# Altium footprint library PcbLib1.PcbLib: 105 footprints (part 7 of 7)
Each footprint in its own frame and in the unit in brackets; x right, y up, seen from the top. Pads: shape width x height; smd on the part's side, far side on the other; paste and mask are expansions set on the pad; w line width, h text height; cw(c..) or ccw(c..) is an arc to the next point about the centre after c.
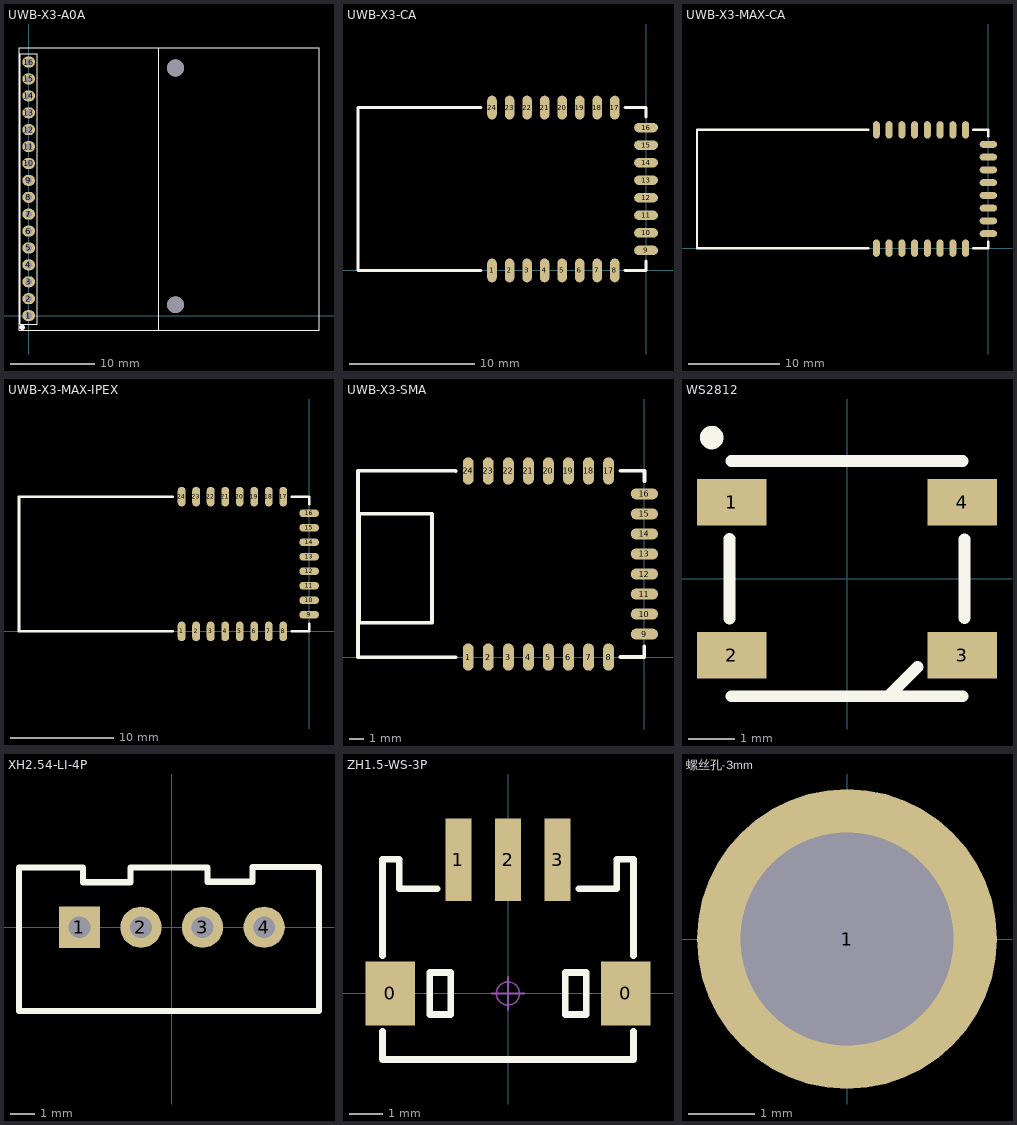
[diagram p6: the footprints below, top view; thin cyan lines are the x and y axes]

## UWB-X3-A0A [mm]
height 1.1
pads (16):
  oval 1.5x1.3 hole 0.8: 1(0,0) 2(0,2) 3(0,4) 4(0,6) 5(0,8) 6(0,10) 7(0,12) 8(0,14) 9(0,16) 10(0,18) 11(0,20) 12(0,22) 13(0,24) 14(0,26) 15(0,28) 16(0,30)
via 17.354,1.28 diameter 2 hole 2
via 17.354,29.28 diameter 2 hole 2
Top Overlay:
  circle w0.3: c-0.762,-1.397 r0.15
  lines w0.1: 15.409,-1.677 15.409,31.642 ; -1.146,-1.72 34.349,-1.72 34.349,31.679 -1.146,31.679 -1.146,-1.72 ; -1,-1 1,-1 1,31 -1,31 -1,-1
3D body: height 1.27, standoff 0, extent 21.654,2.988 29.654,10.982
3D body: height 1.27, standoff 0, extent 22.035,19.752 30.035,27.746
3D body: height 3, standoff 0.03, extent 3.62,0 16.701,29.972
3D body: height 1, standoff 0, extent -1.143,-1.824 1.016,31.623
3D body: height 1, standoff 0, extent 1.016,-1.778 34.417,31.669

## UWB-X3-CA [mil]
pads (24):
  oval 30x75 smd: 1(-484.25,0) 2(-429.13,0) 3(-374.02,0) 4(-318.9,0) 5(-263.78,0) 6(-208.66,0) 7(-153.54,0) 8(-98.43,0) 17(-98.43,511.81) 18(-153.54,511.81) 19(-208.66,511.81) 20(-263.78,511.81) 21(-318.9,511.81) 22(-374.02,511.81) 23(-429.13,511.81) 24(-484.25,511.81)
  oval 75x30 smd: 9(0,62.99) 10(0,118.11) 11(0,173.23) 12(0,228.35) 13(0,283.46) 14(0,338.58) 15(0,393.7) 16(0,448.82)
Top Overlay:
  lines w7.87: -66.93,0 0,0
  lines w10: -905.51,0 -519,-0.01 ; -905.51,0.25 -905.51,512.06 ; -905.51,511.81 -519,511.8 ; -65.74,512.06 0.25,512.06 0.25,483.07 ; 0,28.99 0,0 ; -66,0 -66,0 ; -66,0 -66,0 ; -66,0 0,0 ; 0,0 0,0
3D body: height 43.31, standoff 1, extent -630.24,240.16 -519.75,271.66
3D body: height 118.11, standoff 1, extent -867.2,162.48 -642.79,347.52
3D body: height 118.11, standoff 1, extent -510,69.97 -75.8,440.05
3D body: height 39.37, standoff 0.1, extent -900,0 0,511.81

## UWB-X3-MAX-CA [mil]
pads (24):
  oval 30x75 smd: 1(-484.25,0) 2(-429.13,0) 3(-374.02,0) 4(-318.9,0) 5(-263.78,0) 6(-208.66,0) 7(-153.54,0) 8(-98.43,0) 17(-98.43,511.81) 18(-153.54,511.81) 19(-208.66,511.81) 20(-263.78,511.81) 21(-318.9,511.81) 22(-374.02,511.81) 23(-429.13,511.81) 24(-484.25,511.81)
  oval 75x30 smd: 9(0,62.99) 10(0,118.11) 11(0,173.23) 12(0,228.35) 13(0,283.46) 14(0,338.58) 15(0,393.7) 16(0,448.82)
Top Overlay:
  lines w7.87: -66.93,0 0,0
  lines w10: -1259.84,0 -519,-0.01 ; -1259.84,0.25 -1259.84,512.06 ; -1259.84,511.81 -519,511.8 ; -65.74,512.06 0.25,512.06 0.25,483.07 ; 0,28.99 0,0 ; -66,0 -66,0 ; -66,0 -66,0 ; -66,0 0,0 ; 0,0 0,0
3D body: height 43.31, standoff 1, extent -1000.24,254.26 -889.76,285.75
3D body: height 118.11, standoff 1, extent -1237.2,172.48 -1012.79,357.52
3D body: height 118.11, standoff 1, extent -860,69.97 -75.8,440.05
3D body: height 39.37, standoff 0.1, extent -1260,0 0,511.81

## UWB-X3-MAX-IPEX [mil]
pads (24):
  oval 30x75 smd: 1(-484.25,0) 2(-429.13,0) 3(-374.02,0) 4(-318.9,0) 5(-263.78,0) 6(-208.66,0) 7(-153.54,0) 8(-98.43,0) 17(-98.43,511.81) 18(-153.54,511.81) 19(-208.66,511.81) 20(-263.78,511.81) 21(-318.9,511.81) 22(-374.02,511.81) 23(-429.13,511.81) 24(-484.25,511.81)
  oval 75x30 smd: 9(0,62.99) 10(0,118.11) 11(0,173.23) 12(0,228.35) 13(0,283.46) 14(0,338.58) 15(0,393.7) 16(0,448.82)
Top Overlay:
  lines w7.87: -66.93,0 0,0
  lines w10: -1102.36,0 -519,-0.01 ; -1102.36,0.25 -1102.36,512.06 ; -1102.36,511.81 -519,511.8 ; -65.74,512.06 0.25,512.06 0.25,483.07 ; 0,28.99 0,0 ; -66,0 -66,0 ; -66,0 -66,0 ; -66,0 0,0 ; 0,0 0,0
3D body: height 43.31, standoff 1, extent -950.24,256.76 -839.75,273.25
3D body: height 118.11, standoff 1, extent -1053.6,226.25 -986.4,303.76
3D body: height 118.11, standoff 1, extent -805,69.97 -75.8,440.05
3D body: height 39.37, standoff 0.1, extent -1100,0 0,511.81

## UWB-X3-SMA [mil]
pads (24):
  oval 30x75 smd: 1(-484.25,0) 2(-429.13,0) 3(-374.02,0) 4(-318.9,0) 5(-263.78,0) 6(-208.66,0) 7(-153.54,0) 8(-98.43,0) 17(-98.43,511.81) 18(-153.54,511.81) 19(-208.66,511.81) 20(-263.78,511.81) 21(-318.9,511.81) 22(-374.02,511.81) 23(-429.13,511.81) 24(-484.25,511.81)
  oval 75x30 smd: 9(0,62.99) 10(0,118.11) 11(0,173.23) 12(0,228.35) 13(0,283.46) 14(0,338.58) 15(0,393.7) 16(0,448.82)
Top Overlay:
  lines w7.87: -66.93,0 0,0
  lines w10: -787.4,0 -519,-0.01 ; -787.4,0.25 -787.4,512.06 ; -787.4,511.81 -519,511.8 ; -65.74,512.06 0.25,512.06 0.25,483.07 ; 0,28.99 0,0 ; -66,0 0,0 ; -66,0 -66,0 ; -66,0 -66,0 ; 0,0 0,0 ; -783.8,94.08 -583.8,94.08 -583.8,394.08 -773.8,394.08 -783.8,394.08 -783.8,94.08
3D body: height 43.31, standoff 1, extent -740.24,234.26 -629.76,265.75
3D body "User Library-620-SMA-02-112-TGG SMA Female for PCB edge Mount.step": height 125.98, standoff -112.2, extent -1150.43,127.8 -615,364.01
3D body: height 39.37, standoff 0.1, extent -785,0 0,511.81
3D body: height 118.11, standoff 1, extent -495,69.97 -75.8,440.05

## WS2812 [mm]
pads (4):
  rect 1.5x1 smd: 1(-2.489,1.65) 2(-2.489,-1.65) 3(2.489,-1.65) 4(2.489,1.65)
Top Overlay:
  circle w0.254: c-2.921,3.048 r0.127
  lines w0.254: -2.54,-0.86 -2.54,0.864 ; -2.5,-2.54 2.5,-2.54 ; -2.5,2.54 2.5,2.54 ; 0.897,-2.532 1.524,-1.905 ; 2.54,-0.85 2.54,0.854
3D body "User Library-ws2812B-1.sldprt": height 1.55, standoff -0.02, extent -2.7,-2.482 2.7,2.518

## XH2.54-LI-4P [mm] "接插件，4P  淘宝ID:黄晶宝石   店铺网址:https://shop463601444.taobao.com"
pads (4):
  rect 1.7x1.7 hole 0.9: 1(-3.81,0)
  round 1.7 hole 0.9: 2(-1.27,0) 3(1.27,0) 4(3.81,0)
Top Overlay:
  lines w0.254: -6.299,-3.454 -6.299,2.464 -3.658,2.464 -3.658,1.854 -1.702,1.854 -1.702,2.464 1.473,2.464 1.473,1.88 3.327,1.88 3.327,2.489 6.071,2.489 6.071,-3.454 -6.299,-3.454
3D body "XH2.54-4P.STEP": height 7.03, standoff -2.47, extent -6.31,-3.3 6.31,2.4

## ZH1.5-WS-3P [mm] "长：7.6mm，宽：6.0mm，高：3.7mm"
pads (5):
  rect 1.5x1.95 smd: 0(-3.568,0) 0(3.568,0)
  rect 0.8x2.5 smd: 1(-1.5,4.05) 2(0,4.05) 3(1.5,4.05)
Top Overlay:
  lines w0.203: -3.798,-2 -3.8,-2 ; -3.798,-1.143 -3.8,-1.143 -3.8,-2 ; -3.798,1.143 -3.8,1.143 -3.8,4.064 -3.29,4.064 -3.29,3.175 -2.147,3.175 ; 2.147,3.175 3.29,3.175 3.29,4.064 3.8,4.064 3.8,1.143 3.798,1.143 ; 3.798,-2 3.8,-2 ; 3.798,-1.143 3.8,-1.143 3.8,-2 ; -3.8,-2 3.8,-2 ; 3.8,-2 3.8,-2 ; -2.37,-0.635 -2.37,0.635 -1.735,0.635 -1.735,-0.635 -2.37,-0.635 ; 1.735,-0.635 2.37,-0.635 2.37,0.635 1.735,0.635 1.735,-0.635
Mechanical 15:
  circle w0.05: c0,0 r0.35
  lines w0.05: -0.5,0 0.5,0 ; 0,-0.5 0,0.5
3D body "ZH1.5-WS-3P.STEP": height 3.75, standoff 0, extent -3.8,-2 3.8,4.6

## 螺丝孔-3mm [mm]
pads (1):
  round 4.5 hole 3.2: 1(0,0)